# Altium footprint library AltiumLibrary.PcbLib: 130 footprints (part 3 of 9)
Each footprint in its own frame and in the unit in brackets; x right, y up, seen from the top. Pads: shape width x height; smd on the part's side, far side on the other; paste and mask are expansions set on the pad; w line width, h text height; cw(c..) or ccw(c..) is an arc to the next point about the centre after c.
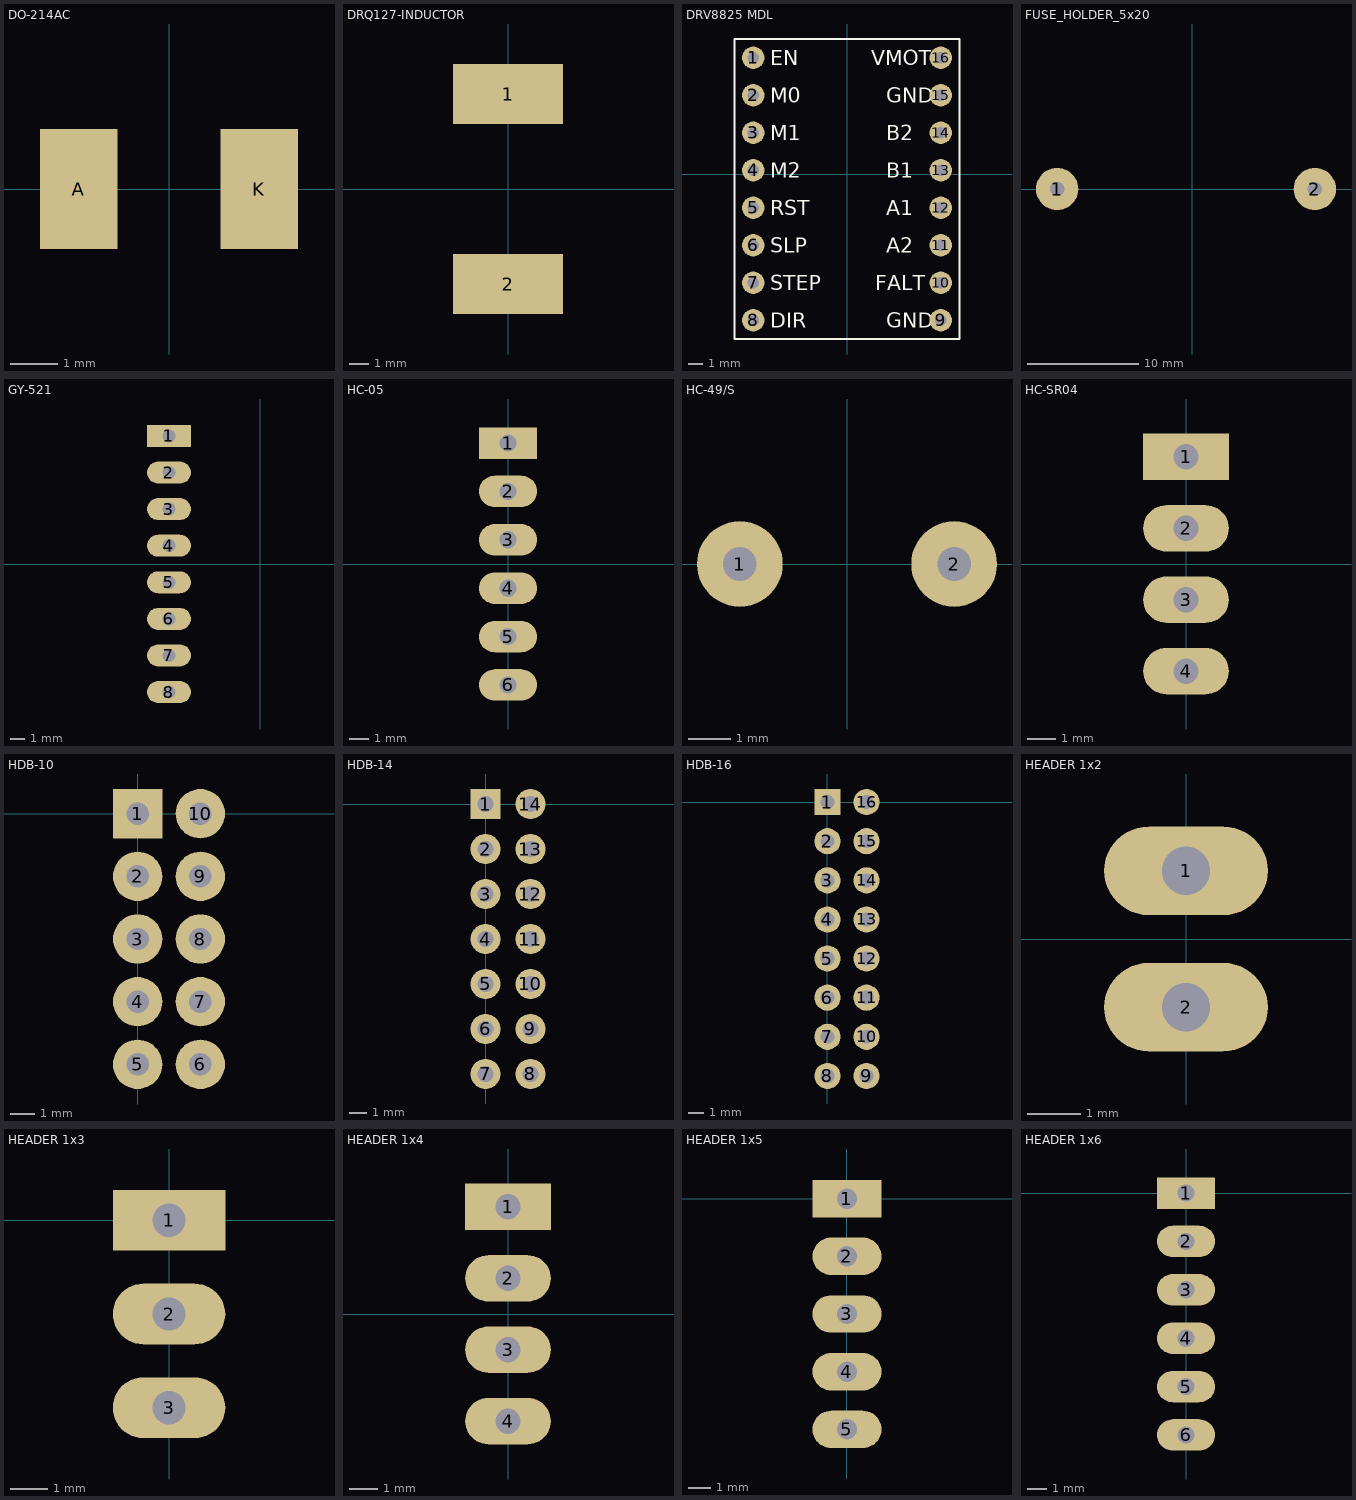
[diagram p2: the footprints below, top view; thin cyan lines are the x and y axes]

## DO-214AC [mil]
pads (2):
  rect 65x100 smd: A(-75.39,0) K(75.39,0)
3D body "User Library-DO-214AC(SMA).step": height 90, standoff 0, extent -107.99,-54.99 108.01,55

## DRQ127-INDUCTOR [mil]
pads (2):
  rect 220x120 smd: 1(0,190) 2(0,-190)
3D body "User Library-DRQ127_12_5x12_5.step": height 310.28, standoff -4.68, extent -246.06,-246.06 246.06,246.07

## DRV8825 MDL [mil]
pads (16):
  round 60 hole 30: 1(-250,310) 2(-250,210) 3(-250,110) 4(-250,10) 5(-250,-90) 6(-250,-190) 7(-250,-290) 8(-250,-390) 9(250,-390) 10(250,-290) 11(250,-190) 12(250,-90) 13(250,10) 14(250,110) 15(250,210) 16(250,310)
Top Overlay:
  lines w5: -300,-440 300,-440 300,360 -300,360 -300,-440
  text "M0" at -205,190 h40
  text "M1" at -205,90 h40
  text "M2" at -205,-10 h40
  text "STEP" at -205,-310 h40
  text "DIR" at -205,-410 h40
  text "GND" at 105,-410 h40
  text "FALT" at 75,-310 h40
  text "A2" at 105,-210 h40
  text "A1" at 105,-110 h40
  text "B1" at 105,-10 h40
  text "B2" at 105,90 h40
  text "GND" at 105,190 h40
  text "VMOT" at 65,290 h40
  text "EN" at -205,290 h40
  text "RST" at -205,-110 h40
  text "SLP" at -205,-210 h40
3D body "DRV8825.step": height 242.5, standoff -190.69, extent -292.12,-440 292.12,360

## FUSE_HOLDER_5x20 [mil]
pads (2):
  round 150 hole 50: 1(-477.97,0.01) 2(433.84,0.01)
3D body "User Library-Fuse_Holder.STEP": height 521.77, standoff -220.2, extent -477.97,-177.16 433.84,177.17

## GY-521 [mil]
pads (8):
  rect 120x60 hole 35.43: 1(-250,350)
  oval 120x60 hole 35.43: 2(-250,250) 3(-250,150) 4(-250,50) 5(-250,-50) 6(-250,-150) 7(-250,-250) 8(-250,-350)
3D body "User Library-GY-521.STEP": height 219.65, standoff -245.7, extent -300,-400 300.2,400

## HC-05 [mil]
pads (6):
  rect 120x65 hole 35.43: 1(0,250)
  oval 120x65 hole 35.43: 2(0,150) 3(0,50) 4(0,-50) 5(0,-150) 6(0,-250)
3D body "hc05.SLDPRT": height 1496.06, standoff -181.1, extent -217.28,-316.93 15,316.93

## HC-49/S [mil]
pads (2):
  round 80 hole 31.5: 1(-100,0) 2(100,0)
3D body "User Library-HP49US.step": height 137.8, standoff -157.48, extent -223.43,-90 223.43,93.07

## HC-SR04 [mil]
pads (4):
  rect 120x65 hole 35.43: 1(0,150)
  oval 120x65 hole 35.43: 2(0,50) 3(0,-50) 4(0,-150)
3D body "HC-SR04.stp": height 799.21, standoff -225.79, extent -708.61,-882.83 10,888.83

## HDB-10 [mm]
pads (10):
  rect 2x2 hole 0.9: 1(0,0)
  round 2 hole 0.9: 2(0,-2.54) 3(0,-5.08) 4(0,-7.62) 5(0,-10.16) 6(2.54,-10.16) 7(2.54,-7.62) 8(2.54,-5.08) 9(2.54,-2.54) 10(2.54,0)
3D body "User Library-HDB-10.step": height 8.8, standoff -3, extent -3.712,-15.18 5.688,5.02

## HDB-14 [mm]
pads (14):
  rect 1.7x1.7 hole 0.9: 1(0,0)
  round 1.7 hole 0.9: 2(0,-2.54) 3(0,-5.08) 4(0,-7.62) 5(0,-10.16) 6(0,-12.7) 7(0,-15.24) 8(2.54,-15.24) 9(2.54,-12.7) 10(2.54,-10.16) 11(2.54,-7.62) 12(2.54,-5.08) 13(2.54,-2.54) 14(2.54,0)
3D body "User Library-HDB-14.step": height 2.49, standoff -9.31, extent -3.712,-20.26 5.688,5.02

## HDB-16 [mm]
pads (16):
  rect 1.7x1.7 hole 0.9: 1(0,0)
  round 1.7 hole 0.9: 2(0,-2.54) 3(0,-5.08) 4(0,-7.62) 5(0,-10.16) 6(0,-12.7) 7(0,-15.24) 8(0,-17.78) 9(2.54,-17.78) 10(2.54,-15.24) 11(2.54,-12.7) 12(2.54,-10.16) 13(2.54,-7.62) 14(2.54,-5.08) 15(2.54,-2.54) 16(2.54,0)
3D body "User Library-HDB-16.step": height 2.49, standoff -9.31, extent -3.43,-22.86 5.97,4.96

## HEADER 1x2 [mil]
pads (2):
  oval 120x65 hole 35.43: 1(0,50) 2(0,-50)
3D body "User Library-Header_Male_2Pin.STEP": height 336.22, standoff -118.11, extent -49.01,-99.99 49.01,100.01

## HEADER 1x3 [mil]
pads (3):
  rect 120x65 hole 35.43: 1(0,0)
  oval 120x65 hole 35.43: 2(0,-100) 3(0,-200)
3D body "User Library-Header_Male_3Pin.STEP": height 336.22, standoff -118.11, extent -49.01,-249.99 49.01,50.01

## HEADER 1x4 [mil]
pads (4):
  rect 120x65 hole 35.43: 1(0,150)
  oval 120x65 hole 35.43: 2(0,50) 3(0,-50) 4(0,-150)
3D body "User Library-Header_Male_4Pin.STEP": height 336.22, standoff -118.11, extent -49.01,-200 49.02,200

## HEADER 1x5 [mil]
pads (5):
  rect 120x65 hole 35.43: 1(0,0)
  oval 120x65 hole 35.43: 2(0,-100) 3(0,-200) 4(0,-300) 5(0,-400)
3D body "User Library-Header_Male_5Pin.STEP": height 336.22, standoff -118.11, extent -49.01,-450 49.02,50

## HEADER 1x6 [mil]
pads (6):
  rect 120x65 hole 35.43: 1(0,0)
  oval 120x65 hole 35.43: 2(0,-100) 3(0,-200) 4(0,-300) 5(0,-400) 6(0,-500)
3D body "User Library-Header_Male_2Pin.STEP": height 336.22, standoff -118.11, extent -49.01,-549.99 49.01,-349.99
3D body "User Library-Header_Male_2Pin.STEP": height 336.22, standoff -118.11, extent -49.01,-349.99 49.01,-149.99
3D body "User Library-Header_Male_2Pin.STEP": height 336.22, standoff -118.11, extent -49.01,-149.99 49.01,50.01